# Altium footprint library CM3Board.PcbLib: 127 footprints (part 1 of 8)
Each footprint in its own frame and in the unit in brackets; x right, y up, seen from the top. Pads: shape width x height; smd on the part's side, far side on the other; paste and mask are expansions set on the pad; w line width, h text height; cw(c..) or ccw(c..) is an arc to the next point about the centre after c.
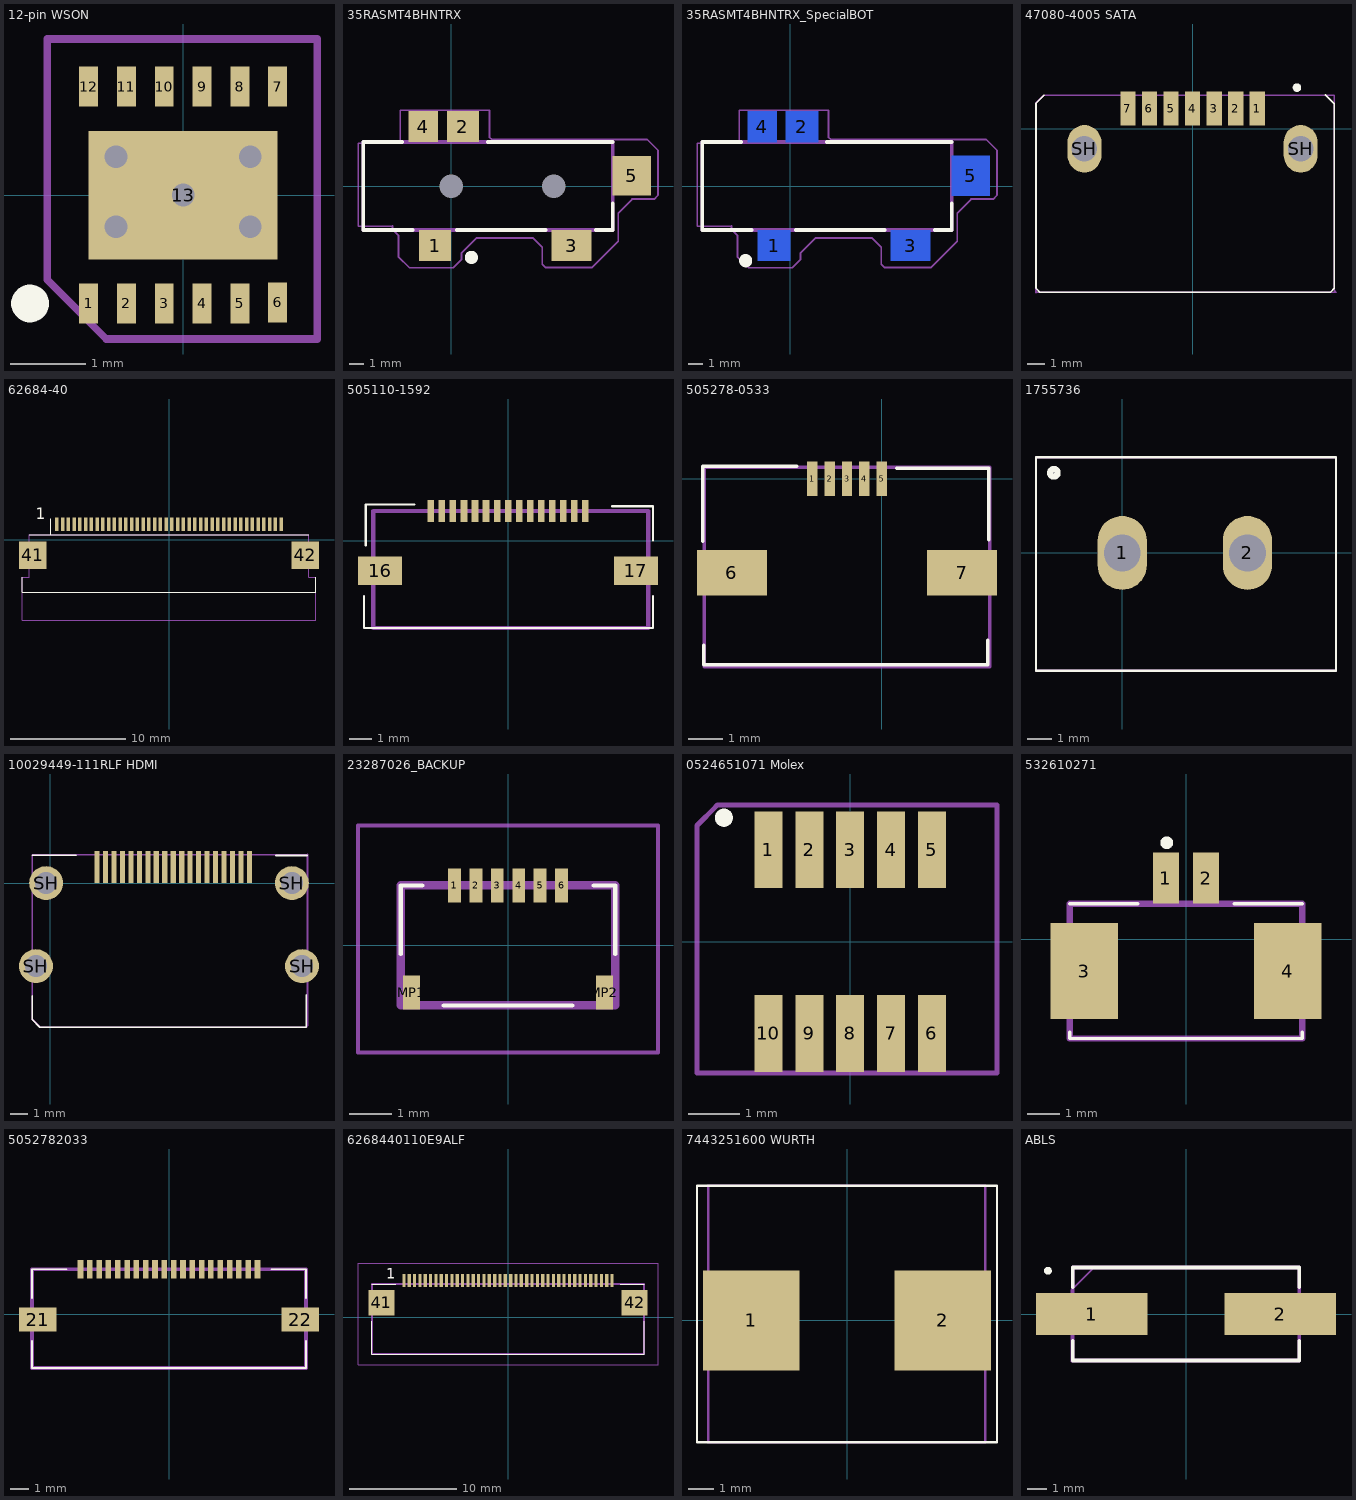
[diagram p0: the footprints below, top view; thin cyan lines are the x and y axes]

## 12-pin WSON [mm] "3.1x3.1mm 0.5mm pitch"
height 1.1
pads (13):
  rect 0.25x0.53 smd: 1(-1.25,-1.435) 2(-0.75,-1.435) 3(-0.25,-1.435) 4(0.25,-1.435) 5(0.75,-1.435) 6(1.25,-1.422) 7(1.25,1.435) 8(0.75,1.435) 9(0.25,1.435) 10(-0.25,1.435) 11(-0.75,1.435) 12(-1.25,1.435)
  rect 2.5x1.7 smd: 13(0,0)
via 0,0 diameter 0.5 hole 0.3
via -0.889,-0.419 diameter 0.5 hole 0.3
via -0.889,0.508 diameter 0.5 hole 0.3
via 0.889,0.508 diameter 0.5 hole 0.3
via 0.889,-0.419 diameter 0.5 hole 0.3
Top Overlay:
  circle w0.25: c-2.025,-1.435 r0.125
Mechanical 29:
  lines w0.1: -1.799,-1.122 -1.016,-1.905 1.775,-1.905 1.775,2.064 -1.799,2.064 -1.799,-1.122
  text ".Designator" at -1.016,-0.254 h1
3D body "12-wson3.1x3.1.STEP": height 0.8, standoff 0, extent -1.5,-1.476 1.5,1.524

## 35RASMT4BHNTRX [mm]
pads (7):
  rect 2.2x2.1 smd: 1(-1.1,-4.05) 2(0.8,4.05)
  rect 2.7x2.1 smd: 3(8.2,-4.05)
  rect 2x2.1 smd: 4(-1.9,4.05)
  rect 2.6x2.7 smd: 5(12.3,0.7)
  round 0 hole 1.6: 6(0,0) 7(7,0)
Top Overlay:
  circle w0.5: c1.38,-4.86 r0.198
  lines w0.254: -3.348,3 -6,3 -6,-3 -2.636,-3 ; 0.387,-3 6.435,-3 ; 2.5,3 11,3 ; 9.858,-3 11,-3 11,-1.171
Mechanical 13:
  lines w0.254: -6,-3 11,-3 11,3 -6,3 -6,-3
Mechanical 29:
  lines w0.1: -3.99,-2.73 -6.35,-2.73 -6.35,2.92 -6,2.92 -3.47,2.92 -3.47,5.17 2.6,5.17
  lines w0.127: -3.99,-2.73 -3.99,-2.97 -3.6,-3.36 -3.6,-4.81 -2.84,-5.57 0.14,-5.57 0.69,-5.02 0.69,-4.58 1.74,-3.53 5.57,-3.53 6.2,-4.16 6.2,-5.32 6.43,-5.55 9.58,-5.55 11.38,-3.75 11.38,-1.84 12.33,-0.89 13.83,-0.89 14.09,-0.63 14.09,2.43 13.34,3.18 2.76,3.18 2.6,3.34 2.6,5.17
  text ".Designator" at -5.24,-1.2 h1.52
3D body "35RASMT4BHNTRX.STEP": height 5.1, standoff -0.89, extent -5.91,-4.562 13.09,4.43

## 35RASMT4BHNTRX_SpecialBOT [mm]
pads (5):
  rect 2.2x2.1 smd far side: 1(-1.1,-4.05) 2(0.8,4.05)
  rect 2.7x2.1 smd far side: 3(8.2,-4.05)
  rect 2x2.1 smd far side: 4(-1.9,4.05)
  rect 2.6x2.7 smd far side: 5(12.3,0.7)
Top Overlay:
  circle w0.5: c-3.036,-5.084 r0.198
  lines w0.254: -3.348,3 -6,3 -6,-3 -2.636,-3 ; 0.387,-3 6.435,-3 ; 2.5,3 11,3 ; 9.858,-3 11,-3 11,-1.171
Mechanical 13:
  lines w0.254: -6,-3 11,-3 11,3 -6,3 -6,-3
Mechanical 29:
  lines w0.1: -3.99,-2.73 -6.35,-2.73 -6.35,2.92 -6,2.92 -3.47,2.92 -3.47,5.17 2.6,5.17
  lines w0.127: -3.99,-2.73 -3.99,-2.97 -3.6,-3.36 -3.6,-4.81 -2.84,-5.57 0.14,-5.57 0.69,-5.02 0.69,-4.58 1.74,-3.53 5.57,-3.53 6.2,-4.16 6.2,-5.32 6.43,-5.55 9.58,-5.55 11.38,-3.75 11.38,-1.84 12.33,-0.89 13.83,-0.89 14.09,-0.63 14.09,2.43 13.34,3.18 2.76,3.18 2.6,3.34 2.6,5.17
  text ".Designator" at -5.24,-1.2 h1.52
3D body "35RASMT4BHNTRX.STEP": height 3.3, standoff -2.69, extent -5.91,-4.562 13.09,4.43

## 47080-4005 SATA [mm]
pads (9):
  rect 0.9x2 smd: 1(3.81,1.18) 2(2.54,1.18) 3(1.27,1.18) 4(0,1.18) 5(-1.27,1.18) 6(-2.54,1.18) 7(-3.81,1.18)
  oval 2x2.8 hole 1.5: SH(-6.37,-1.18) SH(6.37,-1.18)
Top Overlay:
  circle w0.254: c6.15,2.425 r0.125
  lines w0.1: -8.75,1.975 -9.225,1.5 -9.225,-6.15 -9.225,-9.4 -9,-9.625 8.125,-9.625 8.35,-9.4 8.35,1.475 7.825,2
Mechanical 29:
  lines w0.1: -9.225,-9.65 -9.2,-9.625 8.45,-9.625 8.35,-9.525 8.35,1.975 -8.725,1.975 -8.775,1.975 -9.225,1.525 -9.225,-9.65
  text ".Designator" at -4.3,-5.4 h1
3D body "470804005.stp": height 5.92, standoff -2.53, extent -9.195,-9.575 8.345,1.985

## 62684-40 [mm]
pads (42):
  rect 0.3x1.2 smd: 1(-9.75,1.35) 2(-9.25,1.35) 3(-8.75,1.35) 4(-8.25,1.35) 5(-7.75,1.35) 6(-7.25,1.35) 7(-6.75,1.35) 8(-6.25,1.35) 9(-5.75,1.35) 10(-5.25,1.35) 11(-4.75,1.35) 12(-4.25,1.35) 13(-3.75,1.35) 14(-3.25,1.35) 15(-2.75,1.35) 16(-2.25,1.35) 17(-1.75,1.35) 18(-1.25,1.35) 19(-0.75,1.35) 20(-0.25,1.35) 21(0.25,1.35) 22(0.75,1.35) 23(1.25,1.35) 24(1.75,1.35) 25(2.25,1.35) 26(2.75,1.35) 27(3.25,1.35) 28(3.75,1.35) 29(4.25,1.35) 30(4.75,1.35) 31(5.25,1.35) 32(5.75,1.35) 33(6.25,1.35) 34(6.75,1.35) 35(7.25,1.35) 36(7.75,1.35) 37(8.25,1.35) 38(8.75,1.35) 39(9.25,1.35) 40(9.75,1.35)
  rect 2.4x2.4 smd: 41(-11.85,-1.35) 42(11.85,-1.35)
Top Overlay:
  lines w0.1: -12.75,-3.244 -12.75,-4.55 12.75,-4.55 12.75,-3.244 ; -12.15,0.45 12.15,0.45 ; -10.3,0.45 -10.3,1.85
  text "1" at -11.59,1.8 h1
Mechanical 29:
  lines w0.1: -12.75,-7 -12.75,-3.244 -12.15,-3.244 -12.15,0.45 12.15,0.45 12.15,-3.244 12.75,-3.244 12.75,-7 -12.75,-7
  text ".Designator" at -7.53,-3.82 h1.52
3D body "62684-40110E9ALF.stp": height 2.1, standoff 0, extent -12.81,-5.76 12.81,1.71

## 505110-1592 [mm]
pads (17):
  rect 0.3x1 smd: 1(-3.495,1.35) 2(-2.995,1.35) 3(-2.495,1.35) 4(-1.995,1.35) 5(-1.495,1.35) 6(-0.995,1.35) 7(-0.495,1.35) 8(0.005,1.35) 9(0.505,1.35) 10(1.005,1.35) 11(1.505,1.35) 12(2.005,1.35) 13(2.505,1.35) 14(3.005,1.35) 15(3.505,1.35)
  rect 2x1.3 smd: 16(-5.795,-1.35) 17(5.795,-1.35)
Top Overlay:
  lines w0.1: -6.525,-2.5 -6.525,-3.95 6.565,-3.95 6.565,-2.5 ; -6.445,-0.2 -6.445,1.64 -4.245,1.64 ; 4.725,1.57 6.575,1.57 6.575,0.02
Mechanical 29:
  lines w0.2: -6.095,-3.95 -6.095,1.35 6.345,1.35 6.345,-3.95 -6.095,-3.95
  text ".Designator" at -2.725,-1.71 h1
3D body "5051101592.stp": height 1.88, standoff -0.02, extent -6.495,-3.73 6.505,1.57

## 505278-0533 [mm]
pads (7):
  rect 0.3x1 smd: 1(-2,0) 2(-1.5,0) 3(-1,0) 4(-0.5,0) 5(0,0)
  rect 2x1.3 smd: 6(-4.3,-2.7) 7(2.3,-2.7)
Top Overlay:
  lines w0.1: -5.13,-1.8 -5.13,0.27 -5.13,0.36 -2.44,0.36 ; -5.11,-4.77 -5.11,-5.34 3.04,-5.34 3.04,-4.63 ; 0.42,0.3 3.06,0.3 3.06,-1.75 3.07,-1.75
Mechanical 29:
  lines w0.1: -5.13,0.33 -5.09,0.33 ; -5.09,0.33 -5.09,-5.39 3.09,-5.39 3.09,0.33 -5.09,0.33
  text ".Designator" at -3.85,-3.93 h1.52
3D body "5052780533.stp": height 1.88, standoff -0.02, extent -5.04,-5.09 2.96,0.21

## 1755736 [mm]
pads (2):
  oval 2x3 hole 1.5: 1(0,0) 2(5.08,0)
Top Overlay:
  circle w0.254: c-2.775,3.25 r0.152
  lines w0.1: -3.5,-4.775 8.675,-4.775 8.675,3.875 -3.5,3.875 -3.5,-4.725 -3.5,-4.775
Mechanical 29:
  lines w0.1: -3.5,-4.775 -3.5,3.875 8.65,3.875 8.675,3.85 8.675,-4.775 -3.5,-4.775
  text ".Designator" at -2.2,-2.1 h1.52
3D body "1755736_04.stp": height 12.2, standoff -3.7, extent -3.505,-4.75 8.655,3.85

## 10029449-111RLF HDMI [mm]
pads (23):
  rect 0.3x1.9 smd: 1(11.75,0.95) 2(11.25,0.95) 3(10.75,0.95) 4(10.25,0.95) 5(9.75,0.95) 6(9.25,0.95) 7(8.75,0.95) 8(8.25,0.95) 9(7.75,0.95) 10(7.25,0.95) 11(6.75,0.95) 12(6.25,0.95) 13(5.75,0.95) 14(5.25,0.95) 15(4.75,0.95) 16(4.25,0.95) 17(3.75,0.95) 18(3.25,0.95) 19(2.75,0.95)
  round 2 hole 1.3: SH(-0.85,-4.9) SH(-0.25,0) SH(14.25,0) SH(14.85,-4.9)
Top Overlay:
  lines w0.1: -1.075,-6.65 -1.075,-8.05 -0.625,-8.5 15.1,-8.5 15.1,-6.6 ; -1.075,1.65 1.525,1.65 ; 13.3,1.625 15.15,1.625
Mechanical 29:
  lines w0.1: -1.075,-8.025 -1.075,1.675 15.15,1.675 15.175,1.7 15.175,-8.425 15.1,-8.5 -0.6,-8.5 -1.075,-8.025
  text ".Designator" at 4.15,-3.55 h1
3D body "10029449-111RLF.stp": height 6.28, standoff -1.86, extent -1.075,-8.475 15.125,1.625

## 23287026_BACKUP [mm]
pads (8):
  rect 0.3x0.8 smd: 1(-1.25,1.4) 2(-0.75,1.4) 3(-0.25,1.4) 4(0.25,1.4) 5(0.75,1.4) 6(1.25,1.4)
  rect 0.4x0.8 smd: MP1(-2.25,-1.1) MP2(2.25,-1.1)
Top Overlay:
  lines w0.1: -2.5,-0.2 -2.5,1.4 -2,1.4 ; -1.5,-1.4 1.5,-1.4 ; 2,1.4 2.5,1.4 2.5,-0.2
Mechanical 13:
  lines w0.2: -2.5,-1.4 2.5,-1.4 2.5,1.4 -2.5,1.4 -2.5,-1.4
Mechanical 29:
  lines w0.1: -3.5,-2.5 3.5,-2.5 3.5,2.8 -3.5,2.8 -3.5,-2.5
  text ".Designator" at -2.93,-1.52 h1.52
3D body "c-2328702-6-a-3d.stp": height 1.05, standoff -0.01, extent -2.53,-1.616 2.47,2.216

## 0524651071 Molex [mm]
pads (10):
  rect 0.55x1.5 smd: 1(-1.6,1.8) 2(-0.8,1.8) 3(0,1.8) 4(0.8,1.8) 5(1.6,1.8) 6(1.6,-1.8) 7(0.8,-1.8) 8(0,-1.8) 9(-0.8,-1.8) 10(-1.6,-1.8)
Top Overlay:
  circle w0.254: c-2.475,2.425 r0.05
Mechanical 29:
  lines w0.1: -3,-2.575 2.875,-2.575 2.875,2.675 -2.6,2.675 -2.625,2.65 -3,2.275 -3,-2.575
  text ".Designator" at -2.675,-0.65 h1.52
3D body "524651071.stp": height 3.53, standoff -0.02, extent -2.775,-2.05 2.825,2.15

## 532610271 [mm]
pads (4):
  rect 0.8x1.6 smd: 1(-0.625,1.9) 2(0.625,1.9)
  rect 2.1x3 smd: 3(-3.175,-1) 4(3.175,-1)
Top Overlay:
  lines w0.1: -3.625,-2.9 -3.625,-3.1 3.625,-3.1 3.625,-2.9 ; -3.625,1.1 -1.5,1.1 ; 1.5,1.1 3.625,1.1
  lines w0.2: -0.7,3 ccw(c-0.6,3) -0.5,3 ccw(c-0.6,3) -0.7,3
Mechanical 13:
  lines w0.2: -3.625,-3.1 -3.625,1.1 3.625,1.1 3.625,-3.1 -3.625,-3.1
Mechanical 29:
  text ".Designator" at -2.38,-1.49 h1
3D body "53261-0271.stp": height 3.4, standoff 0, extent -3.875,-3.015 3.775,2.185

## 5052782033 [mm]
pads (22):
  rect 0.3x1 smd: 1(-4.75,2.4) 2(-4.25,2.4) 3(-3.75,2.4) 4(-3.25,2.4) 5(-2.75,2.4) 6(-2.25,2.4) 7(-1.75,2.4) 8(-1.25,2.4) 9(-0.75,2.4) 10(-0.25,2.4) 11(0.25,2.4) 12(0.75,2.4) 13(1.25,2.4) 14(1.75,2.4) 15(2.25,2.4) 16(2.75,2.4) 17(3.25,2.4) 18(3.75,2.4) 19(4.25,2.4) 20(4.75,2.4)
  rect 2x1.3 smd: 21(-7.05,-0.3) 22(7.05,-0.3)
Top Overlay:
  lines w0.1: -7.35,-1.45 -7.35,-2.9 7.35,-2.9 7.35,-1.45 ; -7.35,0.85 -7.35,2.4 -5.5,2.4 ; 5.5,2.4 7.35,2.4 7.35,0.85
Mechanical 29:
  lines w0.2: -7.35,-2.9 7.35,-2.9 7.35,2.4 -7.35,2.4 -7.35,-2.9
  text ".Designator" at -3.98,-0.66 h1
3D body "505278-2033.stp": height 1.1, standoff 0, extent -7.92,-2.9 7.92,2.87

## 6268440110E9ALF [mm]
pads (42):
  rect 0.3x1.2 smd: 1(-9.75,3.45) 2(-9.25,3.45) 3(-8.75,3.45) 4(-8.25,3.45) 5(-7.75,3.45) 6(-7.25,3.45) 7(-6.75,3.45) 8(-6.25,3.45) 9(-5.75,3.45) 10(-5.25,3.45) 11(-4.75,3.45) 12(-4.25,3.45) 13(-3.75,3.45) 14(-3.25,3.45) 15(-2.75,3.45) 16(-2.25,3.45) 17(-1.75,3.45) 18(-1.25,3.45) 19(-0.75,3.45) 20(-0.25,3.45) 21(0.25,3.45) 22(0.75,3.45) 23(1.25,3.45) 24(1.75,3.45) 25(2.25,3.45) 26(2.75,3.45) 27(3.25,3.45) 28(3.75,3.45) 29(4.25,3.45) 30(4.75,3.45) 31(5.25,3.45) 32(5.75,3.45) 33(6.25,3.45) 34(6.75,3.45) 35(7.25,3.45) 36(7.75,3.45) 37(8.25,3.45) 38(8.75,3.45) 39(9.25,3.45) 40(9.75,3.45)
  rect 2.4x2.4 smd: 41(-11.85,1.35) 42(11.85,1.35)
Top Overlay:
  lines w0.1: -12.75,-0.4 -12.75,-3.45 12.75,-3.45 12.75,-0.4 ; -12.75,3.1 -10.5,3.1 ; 10.5,3.1 12.75,3.1
  text "1" at -11.42,3.59 h1
Mechanical 13:
  lines w0.2: -12.75,-3.45 -12.75,3.1 12.75,3.1 12.75,-3.45 -12.75,-3.45
Mechanical 29:
  lines w0.1: -14.05,-4.45 -14.05,5.05 14.05,5.05 14.05,-4.45 -14.05,-4.45
  text ".Designator" at -4.91,-2.05 h1.52
3D body "62684-40110E9ALF.stp": height 2.1, standoff 0, extent -12.81,-3.45 12.81,4.02

## 7443251600 WURTH [mm]
pads (2):
  rect 3.85x4 smd: 1(-3.825,0) 2(3.825,0)
Top Overlay:
  lines w0.1: -6,-4.875 6,-4.875 6,5.375 -6,5.375 -6,-4.875
Mechanical 29:
  lines w0.1: -5.55,-4.875 5.525,-4.875 5.525,5.375 -1.475,5.375 -5.55,5.375 -5.55,-4.875
  text ".Designator" at -1.15,-0.6 h1
3D body "STEP-WE-HCI-1050-rev1.stp": height 5, standoff 0, extent -5.55,-4.875 5.45,5.325

## ABLS [mm]
pads (2):
  rect 5.6x2.1 smd: 1(-4.75,0) 2(4.75,0)
Top Overlay:
  lines w0.2: -6.857,2.18 ccw(c-6.95,2.175) -6.857,2.175 ; -5.7,-1.364 -5.7,-2.35 5.7,-2.35 5.7,-1.364 ; -5.7,1.364 -5.7,2.35 5.7,2.35 5.7,1.364
Mechanical 13:
  lines w0.2: -5.7,-2.35 -5.7,2.35 5.7,2.35 5.7,-2.35 -5.7,-2.35
Mechanical 29:
  lines w0.1: -5.775,-2.4 5.675,-2.4 5.675,2.325 -4.65,2.325 -5.775,1.2 -5.775,-2.4
  text ".Designator" at -3.375,-0.55 h1
3D body "User Library-HC49US.STEP": height 4.2, standoff 0, extent -6.5,-2.35 6.2,2.35